# Altium footprint library pw.PcbLib: 210 footprints (part 6 of 14)
Each footprint in its own frame and in the unit in brackets; x right, y up, seen from the top. Pads: shape width x height; smd on the part's side, far side on the other; paste and mask are expansions set on the pad; w line width, h text height; cw(c..) or ccw(c..) is an arc to the next point about the centre after c.
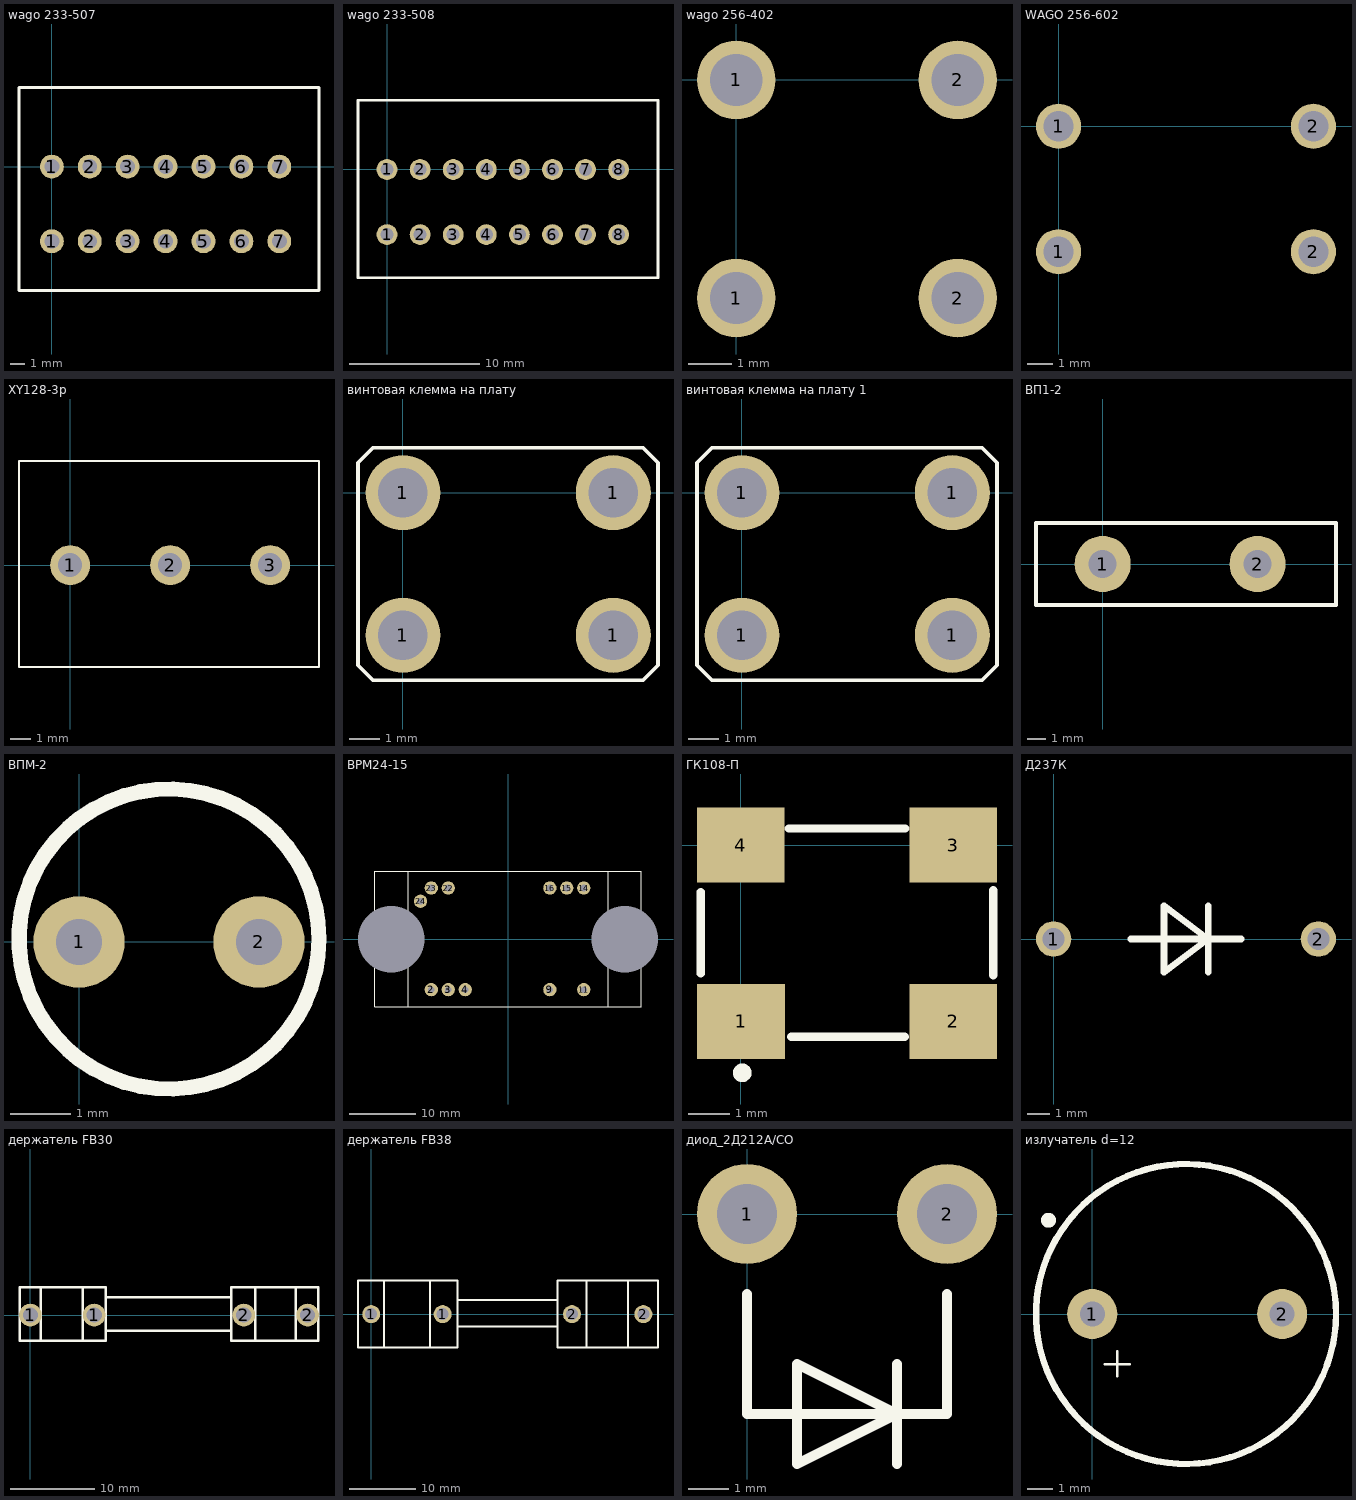
[diagram p5: the footprints below, top view; thin cyan lines are the x and y axes]

## wago 233-507 [mm]
pads (14):
  round 1.6 hole 1: 1(0,-5) 1(0,0) 2(2.54,-5) 2(2.54,0) 3(5.08,-5) 3(5.08,0) 4(7.62,-5) 4(7.62,0) 5(10.16,-5) 5(10.16,0) 6(12.7,-5) 6(12.7,0) 7(15.24,-5) 7(15.24,0)
Top Overlay:
  lines w0.2: 6.78,5.3 11.48,5.3 17.9,5.3 17.9,-8.3 13.9,-8.3 10.22,-8.3 7.58,-8.3 -2.2,-8.3 -2.2,5.3 3.04,5.3 7.04,5.3
3D body "233-507.stp": height 16.44, standoff -4, extent -2.14,-7.5 17.94,4.824

## wago 233-508 [mm]
pads (16):
  round 1.6 hole 1: 1(0,-5) 1(0,0) 2(2.54,-5) 2(2.54,0) 3(5.08,-5) 3(5.08,0) 4(7.62,-5) 4(7.62,0) 5(10.16,-5) 5(10.16,0) 6(12.7,-5) 6(12.7,0) 7(15.24,-5) 7(15.24,0) 8(17.78,-5) 8(17.78,0)
Top Overlay:
  lines w0.2: 6.75,5.3 11.45,5.3 20.8,5.3 20.8,-8.3 13.87,-8.3 10.19,-8.3 7.55,-8.3 -2.23,-8.3 -2.23,5.3 3.01,5.3 7.01,5.3
3D body "233-508.stp": height 16.44, standoff -4, extent -2.01,-7.4 20.61,4.924

## wago 256-402 [mm]
pads (4):
  round 1.8 hole 1.2: 1(0,-5) 1(0,0) 2(5.08,-5) 2(5.08,0)
3D body "256-402_333-000.stp": height 24.07, standoff -2, extent -3.65,-10 9.25,5.025

## WAGO 256-602 [mm]
pads (4):
  round 1.8 hole 1.2: 1(0,-5) 1(0,0) 2(10.16,-5) 2(10.16,0)
3D body "256-602_333-000.stp": height 24.07, standoff -2, extent -3.65,-10.1 19.25,4.925

## XY128-3p [mm] "колодка клеммная"
pads (3):
  round 2 hole 1.2: 1(0,0) 2(5,0) 3(10,0)
Top Overlay:
  lines w0.1: -2.56,-5.09 -2.56,5.21 12.44,5.21 12.44,-5.09 -2.56,-5.09
3D body "User Library-xy128v-3P.STEP": height 14, standoff -3, extent -2.56,-5.09 12.44,5.21

## винтовая клемма на плату [mm]
pads (4):
  round 2.5 hole 1.65: 1(0,-4.75) 1(0,0) 1(7.01,-4.75) 1(7.01,0)
Top Overlay:
  lines w0.125: -1.5,-5.75 -1.5,1 -1,1.5 7.75,1.5 8,1.5 8.5,1 8.5,-5.75 8,-6.25 -1,-6.25 -1.5,-5.75
3D body "User Library-Keystone_7693.STEP": height 8.86, standoff -4.44, extent -1.063,-6.25 8.063,1.75

## винтовая клемма на плату 1 [mm]
pads (4):
  round 2.5 hole 1.65: 1(0,-4.75) 1(0,0) 1(7.01,-4.75) 1(7.01,0)
Top Overlay:
  lines w0.125: -1.5,-5.75 -1.5,1 -1,1.5 7.75,1.5 8,1.5 8.5,1 8.5,-5.75 8,-6.25 -1,-6.25 -1.5,-5.75
3D body "User Library-Keystone_7693.STEP": height 8.86, standoff -4.44, extent -1.063,-6.25 8.063,1.75

## ВП1-2 [mm]
pads (2):
  round 3 hole 1.5: 1(0,0) 2(8.3,0)
Top Overlay:
  lines w0.2: -3.575,-2.2 12.5,-2.2 12.5,2.2 -3.575,2.2 -3.575,-2.2
3D body "ВП-1-2.STEP": height 6.1, standoff -1.9, extent -3.7,-2.1 12.6,2.1

## ВПМ-2 [mil] "предохранитель"
pads (2):
  round 60 hole 30: 1(0,0) 2(118.11,0)
Top Overlay:
  circle w10: c59.06,1.97 r98.43
3D body: height 196.85, standoff 0, extent -18.7,-75.78 138.78,81.7

## ВРМ24-15 [mm]
pads (13):
  round 2 hole 1: 2(-11.5,-7.59) 3(-8.96,-7.59) 4(-6.42,-7.59) 9(6.28,-7.59) 11(11.36,-7.59) 14(11.36,7.65) 15(8.82,7.65) 16(6.28,7.65) 22(-8.96,7.65) 23(-11.5,7.65) 24(-13.12,5.66)
  round 5 hole 10 unplated: ""(-17.5,-0.05) ""(17.5,-0.05)
Top Overlay:
  lines w0.15: -15,-10.15 -15,10.15 ; -11.5,7.65 -11.3,7.65 ; 15,-10.15 15,10.15 ; -20,-10.15 20,-10.15 20,10.15 -20,10.15 -20,-10.15
3D body "МДМ8-1УВ.STP": height 10, standoff -6.15, extent -20.08,-10.18 19.92,10.02

## ГК108-П [mm]
pads (4):
  rect 2.1x1.8 smd: 1(0.005,-4.223) 2(5.08,-4.223) 3(5.08,0) 4(0,0)
Top Overlay:
  circle w0.254: c0.033,-5.451 r0.096
  lines w0.2: -0.961,-3.074 -0.961,-2.1 -0.961,-1.125 ; 1.15,0.397 3.938,0.397 ; 1.209,-4.587 3.924,-4.587 ; 6.039,-3.116 6.039,-2.1 ; 6.044,-2.095 6.044,-1.079
3D body "User Library-KXO-97.step": height 1.8, standoff 0, extent -0.941,-4.613 6.059,0.467

## Д237К [mm]
pads (2):
  round 1.6 hole 1 unplated: 1(0,0) 2(12,0)
Top Overlay:
  lines w0.3: 3.5,0 5,0 ; 7,-1.5 7,0 ; 7,1.5 7,0 ; 8.5,0 7,0 ; 5,0 7,0 ; 5,0 5,1.5 7,0 ; 5,0 5,-1.5 7,0

## держатель FB30 [mm] "6.35x30"
pads (4):
  round 2.7 hole 1.8: 1(0,0) 1(7.6,0) 2(25.4,0) 2(33,0)
Top Overlay:
  lines w0.3: 0.022,0.126 0.222,0.126 ; 1.222,-3 1.222,3.326 ; 6.222,-3 6.222,3.326 ; 9,-1.874 23.79,-1.874 ; 9,2.126 23.84,2.126 ; 26.792,-3.014 26.792,3.31 ; 31.602,-3.074 31.602,3.326 ; -1.278,-3.074 0.222,-3.074 9,-3.074 9,3.326 0.222,3.326 -1.278,3.326 -1.278,-3.074 ; 23.92,-3.074 23.92,3.326 31.722,3.326 34.26,3.326 34.26,-3.074 31.722,-3.074 23.92,-3.074
3D body "User Library-Clips LF-102071 with fuse 6_3x32.STEP": height 10.89, standoff -3.6, extent -1.1,-3.69 34.1,4.21

## держатель FB38 [mm]
pads (4):
  round 2.7 hole 1.8: 1(-0.022,-0.026) 1(10.7,-0.026) 2(30.1,-0.026) 2(40.8,-0.026)
Top Overlay:
  lines w0.3: 0,0.1 0.2,0.1 ; 1.9,-5 1.9,5 ; 8.8,-5 8.8,5 ; 12.9,-1.9 27.9,-1.9 ; 12.9,2.1 27.8,2.1 ; 31.7,-5 43,-5 43,5 31.7,5 ; 32.3,-5 32.3,5 ; 1.9,5 -2,5 -2,-5 2.1,-5 12.9,-5 12.9,5 1.9,5 ; 27.9,-5 38.5,-5 38.5,5 27.9,5 27.9,-5
3D body "fuse10x38_CQ216.stp": height 15.69, standoff -4.59, extent -0.24,-5.5 41.24,5.56

## диод_2Д212А/СО [mm]
pads (2):
  round 2.5 hole 1.5: 1(0,0) 2(5,0)
Top Overlay:
  lines w0.254: 0,-2 0,-5 5,-5 5,-2 ; 3.75,-6.25 3.75,-3.75 ; 1.25,-6.25 3.75,-5 1.25,-3.75 1.25,-6.25
3D body "КД16.stp": height 9, standoff -4, extent -1.49,-2 6.51,2

## излучатель d=12 [mm]
pads (2):
  round 2 hole 1: 1(0,0) 2(7.6,0)
Top Overlay:
  circle w0.3: c-1.75,3.75 r0.15
  circle w0.254: c3.75,0 r6
  lines w0.1: 0.5,-2 1.5,-2 ; 1,-2.5 1,-1.5
3D body "User Library-HCM1206X.STEP": height 9.5, standoff -6.5, extent -2.25,-6 9.75,6